# Altium integrated library LSMD PCB.IntLib: 93 symbols
Pins are listed as number, name and electrical type; pins without a type are passive.

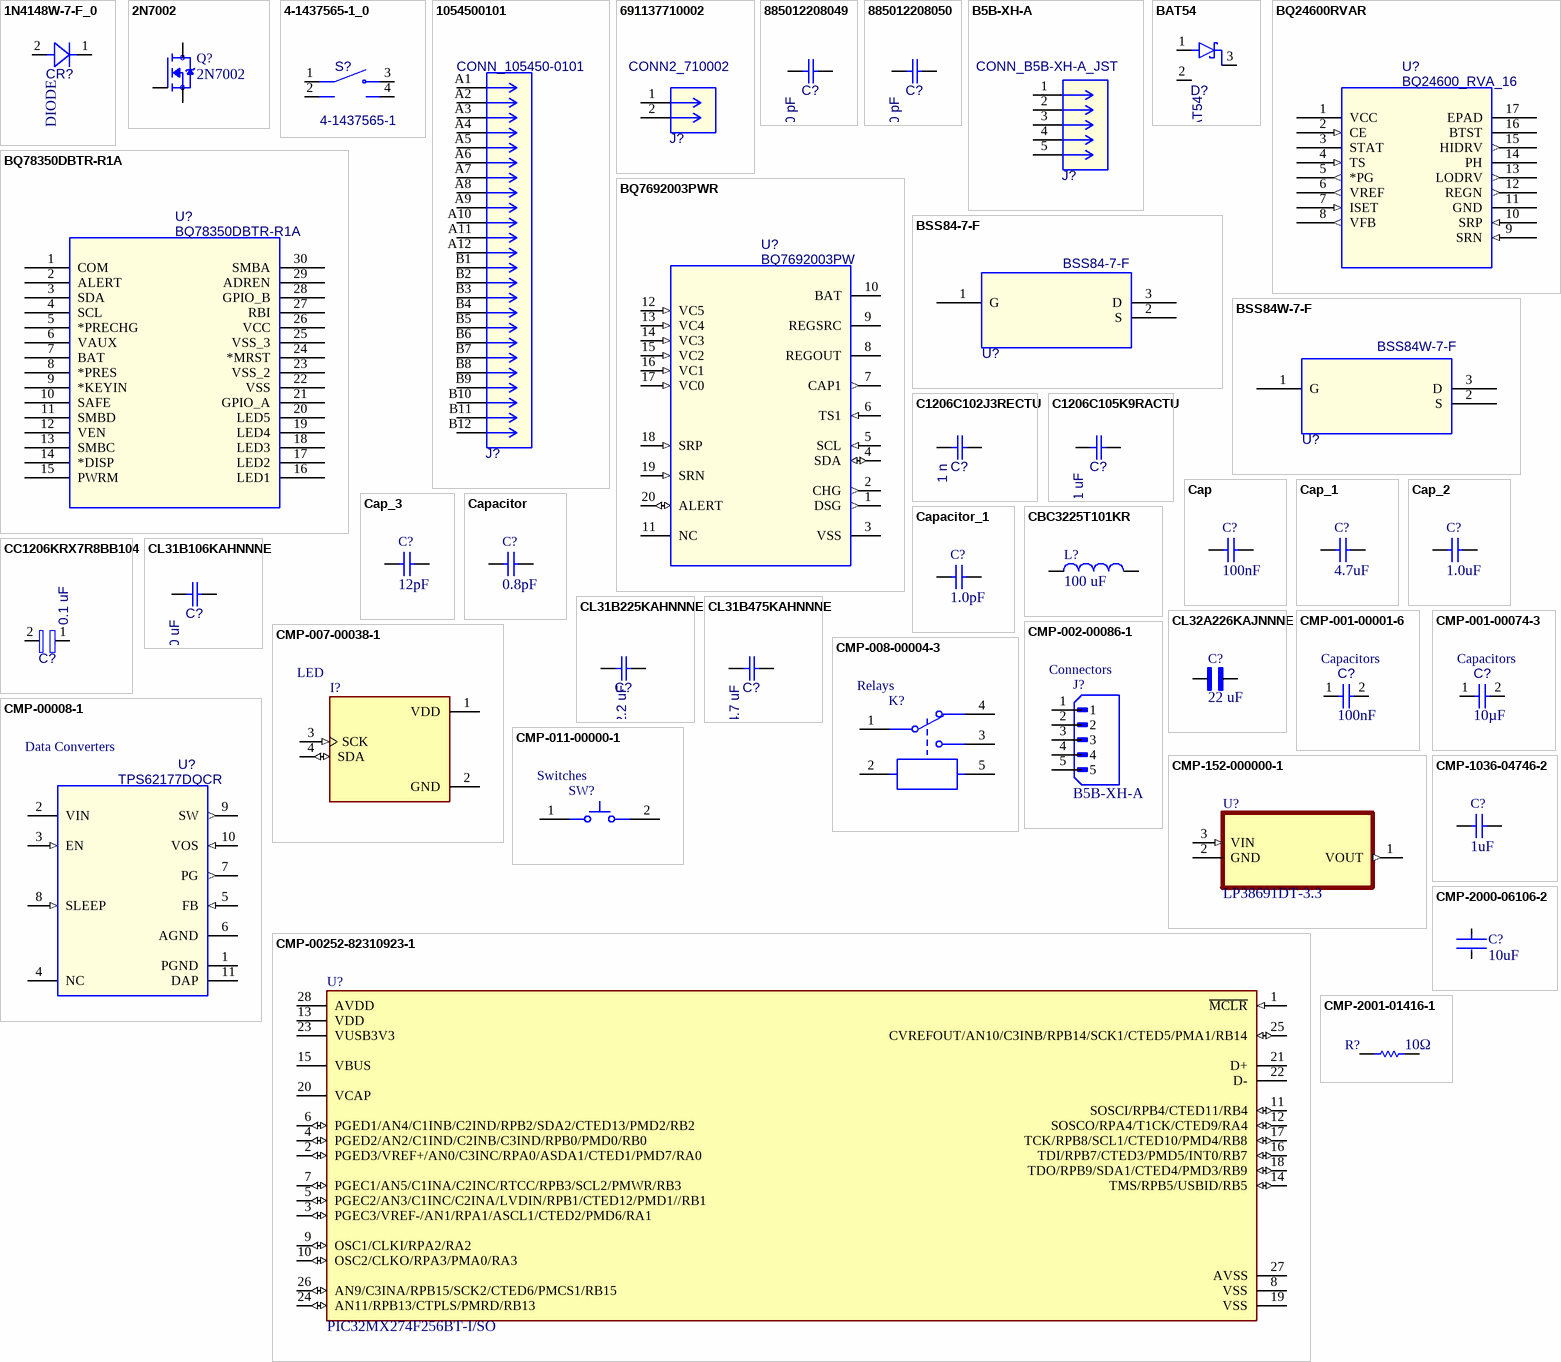
[diagram p0: symbols 1N4148W-7-F_0 to CMP-2001-01416-1]

## 1N4148W-7-F_0
designator CR?, comment DIODE
DIODE; SWT; SMT (SOD-123); PIV=100V; IF=0.3A; -65 DEGC TO +150 DEGC; Manufacturer_Name: Diodes Inc; Manufacturer_Part_Number: 1N4148W-7-F; Part Reference: CR5; PCB Footprint: SOD123_DIO; Copyright: Copyright (C) 2025 Ultra Librarian. All rights reserved.; Value: DIODE; Manufacturer Name: Diodes Inc; Manufacturer Part Number: 1N4148W-7-F; Part Number: 1N4148W-7-F
footprint SOD123_DIO
pins: 1, 2

## 2N7002
designator Q?
Mosfet Array 2 N-Channel (Dual) 60V 300mA 500mW Surface Mount PG-SOT363-6; MF: onsemi; SnapEDA_Link: https://www.snapeda.com/parts/2N7002/Onsemi/view-part/?ref=snap; Package: SOT-23-3 ON Semiconductor; Value: *; MP: 2N7002; Check_prices: https://www.snapeda.com/parts/2N7002/Onsemi/view-part/?ref=eda
footprint SOT95P240X111-3N
pins: 1 G, 2 S, 3 D

## 4-1437565-1_0
designator S?, comment 4-1437565-1
Part Reference: S1; Manufacturer Name: TE Connectivity; PCB Footprint: SW_4-1437565-1; OriginalSymbolOrigin: (-20000,10000); Value: 4-1437565-1; Manufacturer Part Number: 4-1437565-1; Part Number: 4-1437565-1
footprint SW_4-1437565-1
pins: 1 COM, 2 COM__1, 3 NO, 4 NO__1

## 1054500101
designator J?, comment CONN_105450-0101
Universal Serial Bus (USB) Shielded I/O Receptacle, Type C, Right-Angle, Top Mount, Surface Mount, 0.80mm Solder Tabs, Gold (Au) Flash over 0.76m Palladium Nickel Plating; Manufacturer_Name: Molex Connector Corporation; Manufacturer_Part_Number: 1054500101; Part Reference: J3; PCB Footprint: CONN_105450-0101_MOL; Copyright: Copyright (C) 2025 Ultra Librarian. All rights reserved.; Datasheet: https://www.molex.com/en-us/products/part-detail-pdf/1054500101?display=pdf; Value: CONN_105450-0101; Part Number: 1054500101; Manufacturer Part Number: 1054500101; Manufacturer Name: Molex Connector Corporation
footprint CONN_105450-0101_MOL
pins: A1, A2, A3, A4, A5, A6, A7, A8, A9, A10, A11, A12, B1, B2, B3, B4, B5, B6, B7, B8, B9, B10, B11, B12

## 691137710002
designator J?, comment CONN2_710002
WR-TBL Terminal block - Wire protector - THT; Manufacturer_Part_Number: 691137710002; Manufacturer_Name: Wurth Electronics; Part Reference: J2; PCB Footprint: CONN2_710002_WRE; Datasheet: https://www.we-online.com/catalog/datasheet/691137710002.pdf; Copyright: Copyright (C) 2025 Ultra Librarian. All rights reserved.; Value: CONN2_710002; Part Number: 691137710002; Manufacturer Part Number: 691137710002; Manufacturer Name: Wurth Electronics
footprint CONN2_710002_WRE
pins: 1, 2

## 885012208049
designator C?, comment 3300 pF
WCAP-CSGP General Purpose MLCC; Manufacturer_Name: Wurth Electronics; Manufacturer_Part_Number: 885012208049; Part Reference: C3; PCB Footprint: CAP_885012208_WRE; Copyright: Copyright (C) 2025 Ultra Librarian. All rights reserved.; Datasheet: https://www.we-online.com/catalog/datasheet/885012208049.pdf; Value: 3300 pF; Part Number: 885012208049; Manufacturer Part Number: 885012208049; Manufacturer Name: Wurth Electronics
footprint CAP_885012208_WRE
pins: 1, 2

## 885012208050
designator C?, comment 4700 pF
WCAP-CSGP General Purpose MLCC; Manufacturer_Name: Wurth Electronics; Manufacturer_Part_Number: 885012208050; Part Reference: C20; PCB Footprint: CAP_885012208_WRE; Copyright: Copyright (C) 2025 Ultra Librarian. All rights reserved.; Datasheet: https://www.we-online.com/catalog/datasheet/885012208050.pdf; Value: 4700 pF; Part Number: 885012208050; Manufacturer Part Number: 885012208050; Manufacturer Name: Wurth Electronics
footprint CAP_885012208_WRE
pins: 1, 2

## B5B-XH-A
designator J?, comment CONN_B5B-XH-A_JST
Manufacturer_Name: JST; Part Reference: J1; Manufacturer_Part_Number: B5B-XH-A; Copyright: Copyright (C) 2025 Ultra Librarian. All rights reserved.; Value: CONN_B5B-XH-A_JST; PCB Footprint: CONN_B5B-XH-A_JST; Manufacturer Name: JST; Manufacturer Part Number: B5B-XH-A; Part Number: B5B-XH-A
footprint CONN_B5B-XH-A_JST
pins: 1, 2, 3, 4, 5

## BAT54
designator D?
Schottky, SOT-23, 30V, 0.2A, 150C; Part Reference: D1; PCB Footprint: SOT95P240X120-3N; MF: Diotec; OriginalSymbolOrigin: (-10000,20000); SnapEDA_Link: https://www.snapeda.com/parts/BAT54/Diotec/view-part/?ref=snap; Package: SOT-23 Diotec; MP: BAT54; Check_prices: https://www.snapeda.com/parts/BAT54/Diotec/view-part/?ref=eda; Value: BAT54; Part Number: BAT54; Manufacturer Part Number: BAT54; Manufacturer Name: Diotec
footprint SOT95P240X120-3N
pins: 1, 2 NC, 3

## BQ24600RVAR
designator U?, comment BQ24600_RVA_16
Standalone 1-6 cell Buck battery charge controller 16-VQFN -40 to 85; Manufacturer_Part_Number: BQ24600RVAR; Manufacturer_Name: Texas Instruments; Part Reference: U3; PCB Footprint: RVA16_2P14X2P14; Datasheet: https://www.ti.com/lit/gpn/bq24600; Copyright: Copyright (C) 2025 Ultra Librarian. All rights reserved.; Value: BQ24600_RVA_16; Manufacturer Name: Texas Instruments; Manufacturer Part Number: BQ24600RVAR; Part Number: BQ24600RVAR
footprint RVA16_2P14X2P14
pins: 1 VCC (power), 2 CE (in), 3 STAT, 4 TS (in), 5 *PG (out), 6 VREF (out), 7 ISET (in), 8 VFB (out), 9 SRN (in), 10 SRP (in), 11 GND (power), 12 REGN (out), 13 LODRV (out), 14 PH, 15 HIDRV (out), 16 BTST, 17 EPAD (power)

## BQ78350DBTR-R1A
designator U?
CEDV li-ion gas gauge and battery management controller 30-TSSOP -40 to 85; Manufacturer_Name: Texas Instruments; Part Reference: U2; PCB Footprint: BQ78350DBTR-R1A_TEX; Datasheet: https://www.ti.com/lit/gpn/bq78350-r1a; Manufacturer_Part_Number: BQ78350DBTR-R1A; Copyright: Copyright (C) 2025 Ultra Librarian. All rights reserved.; Value: BQ78350DBTR-R1A; Manufacturer Name: Texas Instruments; Manufacturer Part Number: BQ78350DBTR-R1A; Part Number: BQ78350DBTR-R1A
footprint BQ78350DBTR-R1A_TEX
pins: 1 COM, 2 ALERT, 3 SDA, 4 SCL, 5 *PRECHG, 6 VAUX, 7 BAT, 8 *PRES, 9 *KEYIN, 10 SAFE, 11 SMBD, 12 VEN, 13 SMBC, 14 *DISP, 15 PWRM, 16 LED1, 17 LED2, 18 LED3, 19 LED4, 20 LED5, 21 GPIO_A, 22 VSS, 23 VSS_2, 24 *MRST, 25 VSS_3, 26 VCC, 27 RBI, 28 GPIO_B, 29 ADREN, 30 SMBA

## BQ7692003PWR
designator U?, comment BQ7692003PW
3 to 5-Series Cell Li-Ion and Li-Phosphate Battery Monitor (bq76940 Family) 20-TSSOP -40 to 85; Manufacturer_Part_Number: BQ7692003PWR; Manufacturer_Name: Texas Instruments; Part Reference: U4; Value: BQ7692000PW; PCB Footprint: PW0020A_N; Datasheet: https://www.ti.com/lit/gpn/bq76920; Copyright: Copyright (C) 2025 Ultra Librarian. All rights reserved.; Part Number: BQ7692003PWR; Manufacturer Part Number: BQ7692003PWR; Manufacturer Name: Texas Instruments
footprint PW0020A_N
pins: 1 DSG (out), 2 CHG (out), 3 VSS (power), 4 SDA (io), 5 SCL (in), 6 TS1 (in), 7 CAP1 (out), 8 REGOUT (power), 9 REGSRC (power), 10 BAT (power), 11 NC, 12 VC5 (in), 13 VC4 (in), 14 VC3 (in), 15 VC2 (in), 16 VC1 (in), 17 VC0 (in), 18 SRP (in), 19 SRN (in), 20 ALERT (io)

## BSS84-7-F
designator U?
Manufacturer_Name: Diodes Inc; Part Reference: U1; PCB Footprint: SOT-23_DIO; Copyright: Copyright (C) 2025 Ultra Librarian. All rights reserved.; Manufacturer_Part_Number: BSS84-7-F; Value: BSS84-7-F; Part Number: BSS84-7-F; Manufacturer Part Number: BSS84-7-F; Manufacturer Name: Diodes Inc
footprint SOT-23_DIO
pins: 1 G, 2 S, 3 D

## BSS84W-7-F
designator U?
Manufacturer_Name: Diodes Inc; Part Reference: U5; PCB Footprint: SOT-323_DIO; Manufacturer_Part_Number: BSS84W-7-F; Copyright: Copyright (C) 2025 Ultra Librarian. All rights reserved.; Value: BSS84W-7-F; Part Number: BSS84W-7-F; Manufacturer Part Number: BSS84W-7-F; Manufacturer Name: Diodes Inc
footprint SOT-323_DIO
pins: 1 G, 2 S, 3 D

## C1206C102J3RECTU
designator C?, comment 1 n
ESD SMD Comm X7R, Ceramic, 1000 pF, 5p, 25 VDC, X7R, SMD, MLCC, Temperature Stable, Electro Static Discharge, Class II, 1206; Manufacturer_Name: Kemet; Manufacturer_Part_Number: C1206C102J3RECTU; Part Reference: C2; PCB Footprint: CAPC340180_88N_KEM; Copyright: Copyright (C) 2025 Ultra Librarian. All rights reserved.; Datasheet: https://content.kemet.com/datasheets/KEMC1090X7RESD.pdf; Value: 1 n; Part Number: C1206C102J3RECTU; Manufacturer Part Number: C1206C102J3RECTU; Manufacturer Name: Kemet
footprint CAPC340180_88N_KEM
pins: 1, 2

## C1206C105K9RACTU
designator C?, comment 1 uF
SMD Comm X7R, Ceramic, 1 uF, 10p, 6.3 VDC, X7R, SMD, MLCC, Temperature Stable, Class II, 1206; Manufacturer_Name: Kemet; Manufacturer_Part_Number: C1206C105K9RACTU; Part Reference: C8; PCB Footprint: CAPC340180_140N_KEM; Copyright: Copyright (C) 2025 Ultra Librarian. All rights reserved.; Datasheet: https://content.kemet.com/datasheets/KEMC1002X7RSMD.pdf; Value: 1 uF; Manufacturer Name: Kemet; Manufacturer Part Number: C1206C105K9RACTU; Part Number: C1206C105K9RACTU
footprint CAPC340180_140N_KEM
pins: 1, 2

## Cap
designator C?  value 100nF
Capacitor; Published: 8-Jun-2000; LatestRevisionDate: 17-Jul-2002; LatestRevisionNote: Re-released for DXP Platform.; PackageReference: RAD-0.3; Publisher: Altium Limited; PackageDescription: Radial Cap, Thru-Hole; 2 Leads; 0.3 in Pin Spacing
footprint RAD-0.3 (Radial Cap, Thru-Hole; 2 Leads; 0.3 in Pin Spacing)
simulation model CAP (Capacitor)
signal-integrity model Cap
pins: 1, 2

## Cap_1
designator C?  value 4.7uF
Capacitor; Published: 8-Jun-2000; LatestRevisionDate: 17-Jul-2002; LatestRevisionNote: Re-released for DXP Platform.; PackageReference: RAD-0.3; Publisher: Altium Limited; PackageDescription: Radial Cap, Thru-Hole; 2 Leads; 0.3 in Pin Spacing
footprint RAD-0.3 (Radial Cap, Thru-Hole; 2 Leads; 0.3 in Pin Spacing)
simulation model CAP (Capacitor)
signal-integrity model Cap
pins: 1, 2

## Cap_2
designator C?  value 1.0uF
Capacitor; Published: 8-Jun-2000; LatestRevisionDate: 17-Jul-2002; LatestRevisionNote: Re-released for DXP Platform.; PackageReference: RAD-0.3; Publisher: Altium Limited; PackageDescription: Radial Cap, Thru-Hole; 2 Leads; 0.3 in Pin Spacing
footprint RAD-0.3 (Radial Cap, Thru-Hole; 2 Leads; 0.3 in Pin Spacing)
simulation model CAP (Capacitor)
signal-integrity model Cap
pins: 1, 2

## Cap_3
designator C?  value 12pF
Capacitor; Published: 8-Jun-2000; LatestRevisionDate: 17-Jul-2002; LatestRevisionNote: Re-released for DXP Platform.; PackageReference: RAD-0.3; Publisher: Altium Limited; PackageDescription: Radial Cap, Thru-Hole; 2 Leads; 0.3 in Pin Spacing
footprint RAD-0.3 (Radial Cap, Thru-Hole; 2 Leads; 0.3 in Pin Spacing)
simulation model CAP (Capacitor)
signal-integrity model Cap
pins: 1, 2

## Capacitor
designator C?  value 0.8pF  (hidden comment: Capacitor)
SimulationGenericComponent: True
simulation model C_Capacitor_Default (CAP)
pins: 1, 2

## Capacitor_1
designator C?, comment value 1.0pF  (hidden comment: Capacitor)
SimulationGenericComponent: True
simulation model C_Capacitor_Default (CAP)
pins: 1, 2

## CBC3225T101KR
designator L?, comment 100 uF
100ÂµH Unshielded Wirewound Inductor 340mA 1.82Ohm Max 1210 _3225 Metric_; MP: CBC3225T101KR; MF: Taiyo Yuden; Price: None; SnapEDA_Link: https://www.snapeda.com/parts/CBC3225T101KR/Taiyo%20Yuden/view-part/1502545/?ref=snap; Package: 3225 Taiyo Yuden; Value: *; Availability: Unavailable
footprint INDC3225X270N
pins: 1, 2

## CC1206KRX7R8BB104
designator C?, comment 0.1 uF
Part Reference: C15; Manufacturer Name: Yageo; Manufacturer Part Number: CC1206KRX7R8BB104; PCB Footprint: RESC3116X65N; OriginalSymbolOrigin: (0,10000); Value: 0.1 uF; Part Number: CC1206KRX7R8BB104
footprint RESC3116X65N
pins: 1, 2

## CL31B106KAHNNNE
designator C?, comment 10 uF
Manufacturer_Name: Samsung; Manufacturer_Part_Number: CL31B106KAHNNNE; Part Reference: C5; PCB Footprint: CAP_CL31_SAM; Copyright: Copyright (C) 2025 Ultra Librarian. All rights reserved.; Value: 10 uF; Part Number: CL31B106KAHNNNE; Manufacturer Part Number: CL31B106KAHNNNE; Manufacturer Name: Samsung
footprint CAP_CL31_SAM
pins: 1, 2

## CL31B225KAHNNNE
designator C?, comment 2.2 uF
Manufacturer_Name: Samsung; Manufacturer_Part_Number: CL31B225KAHNNNE; Part Reference: C6; PCB Footprint: CAP_CL31_SAM; Copyright: Copyright (C) 2025 Ultra Librarian. All rights reserved.; Value: 2.2 uF; Part Number: CL31B225KAHNNNE; Manufacturer Part Number: CL31B225KAHNNNE; Manufacturer Name: Samsung
footprint CAP_CL31_SAM
pins: 1, 2

## CL31B475KAHNNNE
designator C?, comment 4.7 uF
Manufacturer_Name: Samsung; Manufacturer_Part_Number: CL31B475KAHNNNE; Part Reference: C21; PCB Footprint: CAP_CL31_SAM; Copyright: Copyright (C) 2025 Ultra Librarian. All rights reserved.; Value: 4.7 uF; Part Number: CL31B475KAHNNNE; Manufacturer Part Number: CL31B475KAHNNNE; Manufacturer Name: Samsung
footprint CAP_CL31_SAM
pins: 1, 2

## CL32A226KAJNNNE
designator C?, comment 22 uF
Capacitor: ceramic; MLCC; 22uF; 25V; X5R; Â±10%; SMD; 1210; -55Ã·85Â°C; MF: Samsung Electro-Mechanics; MP: CL32A226KAJNNNE; SnapEDA_Link: https://www.snapeda.com/parts/CL32A226KAJNNNE/Samsung/view-part/?ref=snap; Package: SMD-2 Samsung; Value: *; Check_prices: https://www.snapeda.com/parts/CL32A226KAJNNNE/Samsung/view-part/?ref=eda
footprint CAPC3225X270N
pins: 1, 2

## CMP-001-00001-6
designator C?, comment value 100nF  Component Type: Capacitors  (hidden comment: Capacitor 0.1 uF +/- 5% 16 V 0402)
Chip Capacitor, 0.1 uF, +/- 5%, 16 V, 0402 (1005 Metric); Manufacturer: KEMET; Manufacturer Part Number: C0402C104J4RACTU; Manufacturer: Murata; Manufacturer Part Number: GRM155R71C104JA88D; Voltage Rating: 16V; Capacitor Type: Ceramic; Pins: 2; Max Operating Temperature: 125°C; Mounting Technology: SM; Case/Package: 0402; Min Operating Temperature: -55°C; RoHS Compliant: True; Tolerance: 5%
footprint CAPC1005X56X25LL10T15 (Chip Capacitor, 2-Leads, Body 1.10x0.60mm, IPC High Density)
footprint CAPC1005X56X25NL10T15 (Chip Capacitor, 2-Leads, Body 1.10x0.60mm, IPC Medium Density)
footprint CAPC1005X56X25ML10T15 (Chip Capacitor, 2-Leads, Body 1.10x0.60mm, IPC Low Density)
pins: 1, 2

## CMP-001-00074-3
designator C?, comment value 10µF  Component Type: Capacitors  (hidden comment: Capacitor 10µF +/-40% 6.3V 0402)
Chip Capacitor, 10µF +/-40%, 6.3V, 0402, Thickness 0.6 mm; Manufacturer: Murata; Manufacturer Part Number: GRM155R60J106ME15D; Tolerance: 10%; Max Operating Temperature: 85°C; Voltage Rating: 6.3V; Case/Package: 0402; Min Operating Temperature: -55°C; Mounting Technology: SMT; Pins: 2
footprint CAPC0402(1005)60_L (Chip Capacitor, Body 1.0x0.5mm, Height 0.6mm, IPC High Density)
pins: 1, 2

## CMP-002-00086-1
designator J?, comment B5B-XH-A  Component Type: Connectors
Connector Header Through Hole 5 position 0.098 (2.50mm); MF: JST Sales; Source: B5B-XH-A.SchLib; Case/Package: None; SnapEDA_Link: https://www.snapeda.com/parts/B5B-XH-A/JST+Sales+America+Inc./view-part/?ref=snap; Component Type: Standard; Pins: 5; MP: B5B-XH-A; Value: *; Check_prices: https://www.snapeda.com/parts/B5B-XH-A/JST+Sales+America+Inc./view-part/?ref=eda; Design Item ID: B5B-XH-A
footprint JST_B5B-XH-A
pins: 1, 2, 3, 4, 5

## CMP-007-00038-1
designator I?  Component Type: LED
Non-Touch Graphic LCD Display Module Transmissive White OLED, Monochrome I2C 1.3 (33.02mm) 128 x 64; MP: OLED 128x64 1.3&quot; I2C; MF: UNIVERSAL-SOLDER Electronics Ltd; SnapEDA_Link: https://www.snapeda.com/parts/OLED%20128x64%201.3%22%20I2C/UNIVERSAL-SOLDER+Electronics+Ltd/view-part/?ref=snap; Design Item ID: OLED_128X64_1.3_I2C; Component Type: Standard; Value: *; Check_prices: https://www.snapeda.com/parts/OLED%20128x64%201.3%22%20I2C/UNIVERSAL-SOLDER+Electronics+Ltd/view-part/?ref=eda; Pins: 4; Case/Package: None; Source: OLED_128X64_1.3_I2C.SchLib
footprint LCD_OLED_128X64_1.3_I2C
pins: 1 VDD (power), 2 GND (power), 3 SCK (in), 4 SDA (io)

## CMP-00008-1
designator U?, comment TPS62177DQCR  Component Type: Data Converters
28V, 0.5A Step-Down Converter with SNOOZE Mode 10-WSON -40 to 85; Manufacturer_Name: Texas Instruments; Part Reference: U10; PCB Footprint: DQC0010A; TYPE: TYPE; RefDes: RefDes; Copyright: Copyright (C) 2026 Ultra Librarian. All rights reserved.; Manufacturer_Part_Number: TPS62177DQCR; Datasheet: https://www.ti.com/lit/gpn/tps62177; Value: TPS62177DQC; Manufacturer Name: Texas Instruments; Manufacturer Part Number: TPS62177DQCR; Part Number: TPS62177DQCR
footprint DQC0010A
pins: 1 PGND (power), 2 VIN (power), 3 EN (in), 4 NC, 5 FB (in), 6 AGND (power), 7 PG (out), 8 SLEEP (in), 9 SW (out), 10 VOS (in), 11 DAP (power)

## CMP-008-00004-3
designator K?  Component Type: Relays
General Purpose Relay, 24 VDC, 8 A, -40 to 70 degC, 5-Pin THD, RoHS, Bulk; Manufacturer: TE Connectivity; Manufacturer: TE Connectivity (Tyco Electronics); Manufacturer Part Number: RY210024; Contact Form: SPDT; Current Rating: 10A; Operate Time: 9ms; Pins: 5; Datasheet URL: http://www.te.com/commerce/DocumentDelivery/DDEController?Action=showdoc&DocId=Data+Sheet%7FRYII%7F0115%7Fpdf%7FEnglish%7FENG_DS_RYII_0115.pdf%7F3-1393224-8; Max Operating Temperature: 70°C; RoHS Compliant: True; Mounting Technology: ThroughHole; Datasheet Version: Rev. 0115, 01/2015; Min Operating Temperature: -40°C; Package Description: 5-Pin Through Hole Device, Body 28.5 x 10.1 mm; Package Reference: RY210024
footprint TECO-RY210024_V (THD, 5-Leads, Body 28.5x10.1mm)
pins: 1, 2, 3, 4, 5

## CMP-011-00000-1
designator SW?  Component Type: Switches
Tactile Switch, SPST-NO, 0.05 A, 12 V, -25 to 70 degC, 2-Pin SMD, RoHS, Tape and Reel; Manufacturer: Omron Electronic Components; Manufacturer: Omron; Manufacturer Part Number: B3U-1000P; Contact Current Rating: 50mA; Max Voltage Rating (DC): 12V; Resistance: 0.1Ohm; Max Contact Resistance: 100mohm; Throw Configuration: SPST; Operating Force: 153gf; IP Rating: IP40; Min Operating Temperature: -25°C; RoHS Compliant: True; Package Description: 2-Pin Surface Mount Device, Body 3 x 2.5 mm; Packaging: TapeandReel; Package Reference: B3U-1000; Datasheet URL: http://www.omron.com/ecb/products/pdf/en-b3u.pdf; Contact Material: Silver; Max Current Rating: 50mA; Max Operating Temperature: 70°C; Voltage Rating: 12V; Voltage Rating (DC): 12V; Datasheet Version: Jan-15; Manufacturer URL: http://www.omron.com/; Current Rating: 50mA; Case/Package: B3U-1000; Package Quantity: 3500; Mounting Technology: SM
footprint OMRON-B3U-1000_V (SMD, 2-Leads, Body 3x2.5mm)
pins: 1, 2

## CMP-152-000000-1
designator U?, comment LP38691DT-3.3
500-mA, 10-V, low-dropout voltage regulator 3-TO-252 -40 to 125; MF: Texas Instruments; Check_prices: https://www.snapeda.com/parts/LP38691DT-3.3/Texas+Instruments/view-part/?ref=eda; Value: *; Availability: In Stock; MP: LP38691DT-3.3; Price: None; Package: TO-252-3 Texas Instruments; SnapEDA_Link: https://www.snapeda.com/parts/LP38691DT-3.3/Texas+Instruments/view-part/?ref=snap; Purchase-URL: https://pricing.snapeda.com/search/part/LP38691DT-3.3/?ref=eda
footprint TO228P1042X238-3N
pins: 1 VOUT (out), 2 GND, 3 VIN (in)

## CMP-00252-82310923-1
designator U?, comment PIC32MX274F256BT-I/SO
PIC32MX274F256BT-I/SO MCU 32-bit MIPS32 M4K RISC 256KB Flash 2.5V/3.3V 28-Pin SOIC W T/R; NexarPartId: 82310923; Number of Timers/Counters: 5; Number of SPI Channels: 2; Interface: I2C, I2S, IrDA, LIN, Parallel, SPI, UART, USB; Number of A/D Converters: 1; Max Supply Voltage: 3.6V; Number of I/Os: 17; Frequency: 72MHz; Data Bus Width: 32b; Max Junction Temperature (Tj): 125°C; RAM Size: 64kB; Number of ADC Channels: 9; Min Supply Voltage: 2.5V; Schedule B: 8542310000, 8542310000; Min Operating Temperature: -40°C; RoHS: Non-Compliant; Number of USB Channels: 1; Number of PWM Channels: 5; Height: 2.65mm; Max Operating Temperature: 85°C; Number of UART Channels: 2; Number of I2C Channels: 2; Memory Size: 256kB; Memory Type: FLASH; Ambient Temperature Range High: 85°C; Lifecycle Status: Production
footprint FP-C04-052-MFG (MCU 32-bit MIPS32 M4K RISC 256KB Flash 2.5V/3.3V 28-Pin SOIC W T/R)
footprint FP-C04-052-IPC_A (MCU 32-bit MIPS32 M4K RISC 256KB Flash 2.5V/3.3V 28-Pin SOIC W T/R)
footprint FP-C04-052-IPC_B (MCU 32-bit MIPS32 M4K RISC 256KB Flash 2.5V/3.3V 28-Pin SOIC W T/R)
footprint FP-C04-052-IPC_C (MCU 32-bit MIPS32 M4K RISC 256KB Flash 2.5V/3.3V 28-Pin SOIC W T/R)
pins: 1 ~{MCLR} (in), 2 PGED3/VREF+/AN0/C3INC/RPA0/ASDA1/CTED1/PMD7/RA0 (io), 3 PGEC3/VREF-/AN1/RPA1/ASCL1/CTED2/PMD6/RA1 (io), 4 PGED2/AN2/C1IND/C2INB/C3IND/RPB0/PMD0/RB0 (io), 5 PGEC2/AN3/C1INC/C2INA/LVDIN/RPB1/CTED12/PMD1//RB1 (io), 6 PGED1/AN4/C1INB/C2IND/RPB2/SDA2/CTED13/PMD2/RB2 (io), 7 PGEC1/AN5/C1INA/C2INC/RTCC/RPB3/SCL2/PMWR/RB3 (io), 8 VSS (power), 9 OSC1/CLKI/RPA2/RA2 (io), 10 OSC2/CLKO/RPA3/PMA0/RA3 (io), 11 SOSCI/RPB4/CTED11/RB4 (io), 12 SOSCO/RPA4/T1CK/CTED9/RA4 (io), 13 VDD (power), 14 TMS/RPB5/USBID/RB5 (io), 15 VBUS (power), 16 TDI/RPB7/CTED3/PMD5/INT0/RB7 (io), 17 TCK/RPB8/SCL1/CTED10/PMD4/RB8 (io), 18 TDO/RPB9/SDA1/CTED4/PMD3/RB9 (io), 19 VSS (power), 20 VCAP (power), 21 D+, 22 D-, 23 VUSB3V3 (power), 24 AN11/RPB13/CTPLS/PMRD/RB13 (io), 25 CVREFOUT/AN10/C3INB/RPB14/SCK1/CTED5/PMA1/RB14 (io), 26 AN9/C3INA/RPB15/SCK2/CTED6/PMCS1/RB15 (io), 27 AVSS (power), 28 AVDD (power)

## CMP-1036-04746-2
designator C?, comment 1uF
Manufacturer: Kemet; Part Number: C0805C105K4PACTU
footprint CAPC2013X145X50LL20T25 (Chip Capacitor, 2-Leads, Body 2.00x1.25mm, IPC High Density)
footprint CAPC2013X145X50NL20T25 (Chip Capacitor, 2-Leads, Body 2.00x1.25mm, IPC Medium Density)
footprint CAPC2013X145X50ML20T25 (Chip Capacitor, 2-Leads, Body 2.00x1.25mm, IPC Low Density)
pins: 1, 2
1 alternate drawing of the same symbol

## CMP-2000-06106-2
designator C?, comment 10uF
CAP CER 10UF 16V X7R 0805; Manufacturer Part Number: CL21B106KOQNNNE; Manufacturer: Samsung Electro-Mechanics America, Inc; Material: Ceramic; Tolerance: 10%; Temperature Coefficient: 15%; Digikey Description: CAP CER 10UF 16V X7R 0805; Lead Free: Yes; ComponentLink2URL: http://www.samsungsem.com/servlet/FileDownload?path=productsearch&sname=CL21B106KOQNNNE.pdf&oname=CL21B106KOQNNNE.pdf; ComponentLink2Description: Datasheet; Temperature Range Low: -55°C; RoHS: TRUE; Category: Cap; Temperature Characteristic: X7R; Automotive: No; Octopart: https://octopart.com/cl21b106koqnnne-samsung-19832289; Device Class L3: Ceramic Capacitors; Temperature Range High: +125°C; Height: 1.4mm; Device Class L2: Capacitors; Voltage Rating: 16V; Value: 10uF; Temperature: -55°C to +125°C; Device Class L1: Passive Components; Ipc Land Pattern Name: CAPC200125X125; Package: CL21B106KOQNNNE; Capacitance: 10uF
footprint FP-CL21B106KOQNNNE-MFG
footprint FP-CL21B106KOQNNNE-IPC_C
footprint FP-CL21B106KOQNNNE-IPC_B
footprint FP-CL21B106KOQNNNE-IPC_A
pins: 1, 2

## CMP-2001-01416-1
designator R?, comment 10Ω
Manufacturer: Yageo; Part Number: RC0805JR-1310RL
footprint RESC2013X60X35NL10T20 (Chip Resistor, 2-Leads, Body 2.00x1.25mm, IPC Medium Density)
footprint RESC2013X60X35LL10T20 (Chip Resistor, 2-Leads, Body 2.00x1.25mm, IPC High Density)
footprint RESC2013X60X35ML10T20 (Chip Resistor, 2-Leads, Body 2.00x1.25mm, IPC Low Density)
pins: 1, 2
1 alternate drawing of the same symbol

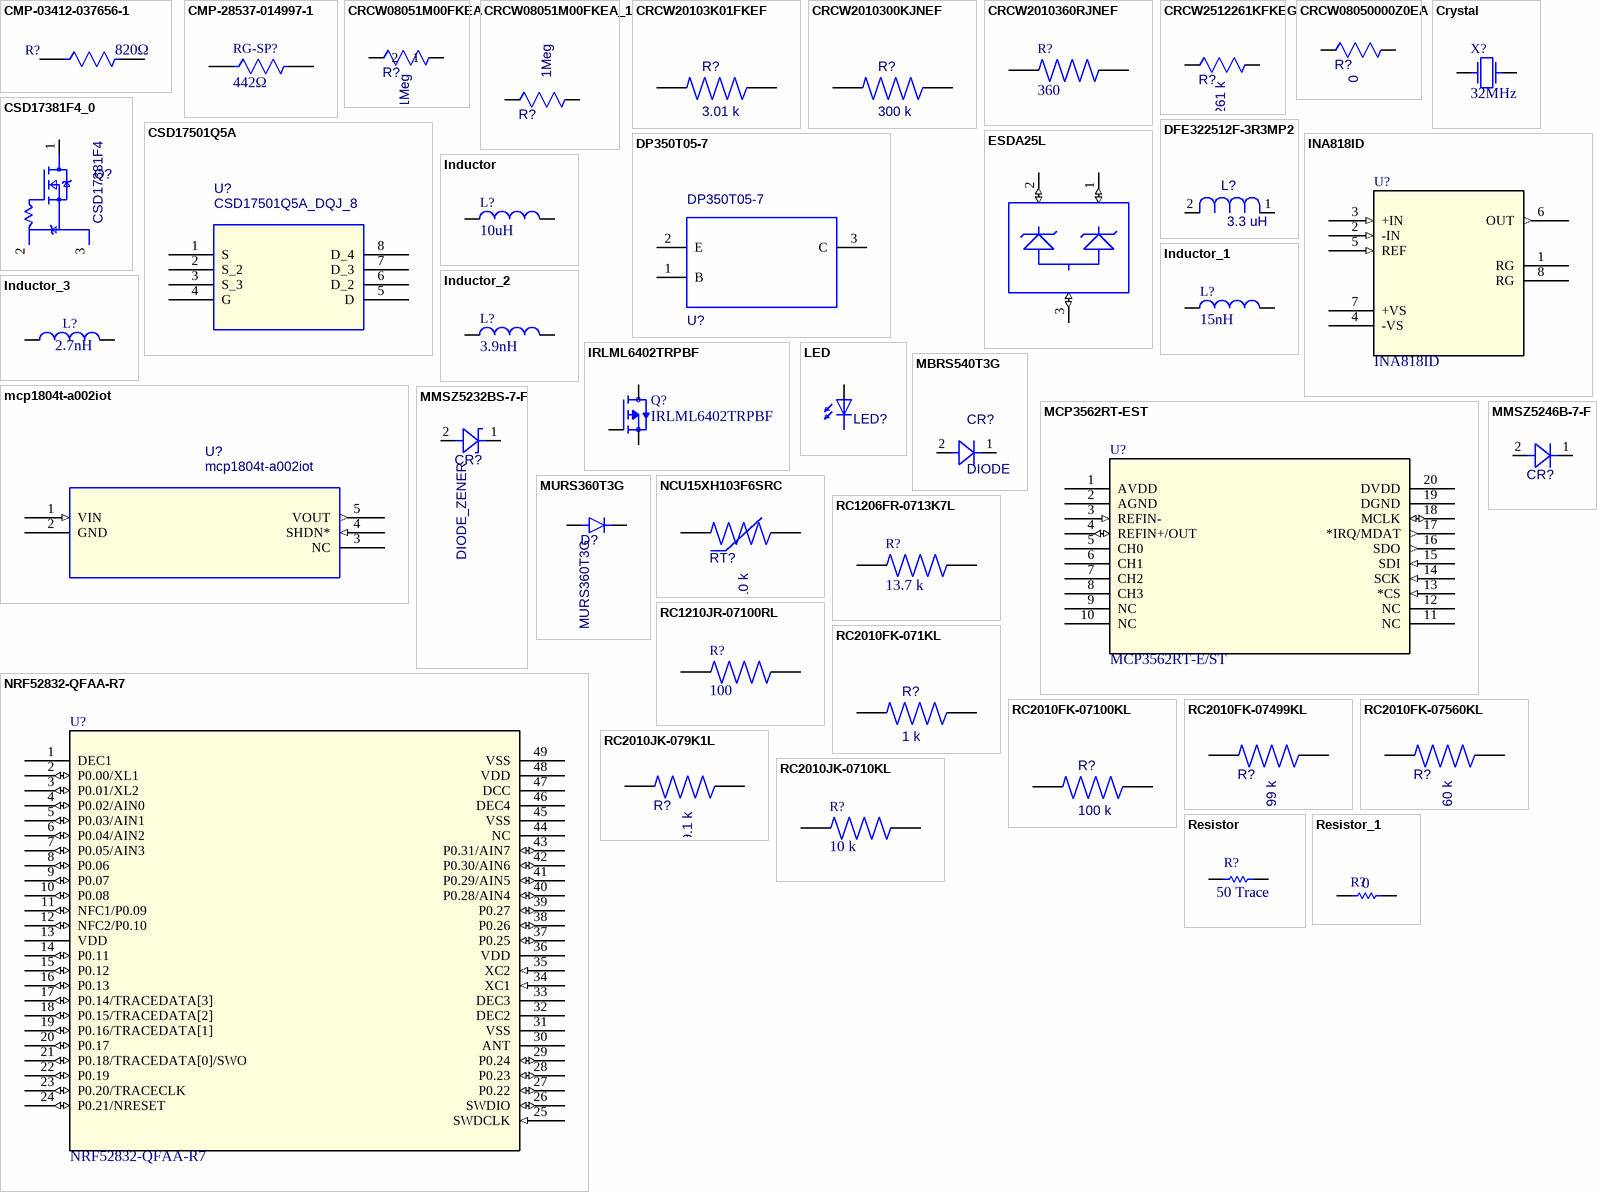
[diagram p1: symbols CMP-03412-037656-1 to Resistor_1]

## CMP-03412-037656-1
designator R?, comment 820Ω
RES SMD 820 OHM 1% 1/8W 0805; Manufacturer: Yageo; Manufacturer Part Number: AC0805FR-07820RL; Voltage Rating: 150V; Tolerance: 0.01; Automotive Grade: Grade 0; Category: Res; Temperature Range Low: -55°C; Lead Free: Yes; Composition: Thick Film; Device Class L1: Passive Components; ComponentLink2URL: http://www.yageo.com/documents/recent/PYu-AC_51_RoHS_L_6.pdf; Ipc Land Pattern Name: RESC200125X50; Series: AC; Package: AC0805; Device Class L2: Resistors; Value: 820Ω; Octopart: https://octopart.com/ac0805fr-07820rl-yageo-26041182; RoHS: TRUE; Temperature Range High: +155°C; Automotive: Yes; Mouser Description: Thick Film Resistors - SMD 1/8W 820ohm 1% AEC-Q200; ComponentLink2Description: Datasheet; Digikey Description: RES SMD 820 OHM 1% 1/8W 0805; Power Rating: 1/8W; Height: 0.6mm; Footprint Url: http://www.yageo.com/exep/pages/download/literatures/PYu-R_Mount_10.pdf; Temperature: -55°C to +155°C; Resistance: 820Ω; Device Class L3: Chip SMD Resistors
footprint FP-AC0805-MFG
footprint FP-AC0805-IPC_C
footprint FP-AC0805-IPC_B
footprint FP-AC0805-IPC_A
pins: 1, 2

## CMP-28537-014997-1
designator RG-SP?, comment 442Ω
Automotive Metal Thin Film Chip Resistor, 0805, 442Ω, 0.1%, 25ppm/°C, 0.125W, 150V; Resistance: 442R; Power Rating: 100mW; Voltage Rating: 100V; Max Power Dissipation: 125mW; Case Code (Imperial): 0805; Features: Automotive AEC-Q200; Case Code (Metric): 2012; Number of Terminations: 2; Resistor Type: Thin Film; Temperature Coefficient: 25ppm/°C; Height: 0.02inch; Case/Package: 0805; Voltage Rating (DC): 150V; Package Quantity: 5000; Lead Free: Lead Free; Width: 1.25mm; Tolerance: 0.1%; Max Operating Temperature: 155°C; Termination: SMD/SMT; RoHS Compliant: Yes; Series: RG; Length: 0.079inch; Min Operating Temperature: -55°C; Packaging: Tape and Reel
footprint FP-RG2012-MFG
footprint FP-RG2012-IPC_C
footprint FP-RG2012-IPC_B
footprint FP-RG2012-IPC_A
pins: 1, 2

## CRCW08051M00FKEA
designator R?, comment 1Meg
D12/CRCW0805 100 1M 1p ET1 e3; Manufacturer_Part_Number: CRCW08051M00FKEA; Manufacturer_Name: Vishay; Part Reference: R11; PCB Footprint: RES_CRCW_0805; Datasheet: https://www.vishay.com/doc?20035; Copyright: Copyright (C) 2025 Ultra Librarian. All rights reserved.; Value: 1Meg; Part Number: CRCW08051M00FKEA; Manufacturer Part Number: CRCW08051M00FKEA; Manufacturer Name: Vishay
footprint RES_CRCW_0805
pins: 1, 2

## CRCW08051M00FKEA_1
designator R?, comment 1Meg
D12/CRCW0805 100 1M 1p ET1 e3; Manufacturer_Part_Number: CRCW08051M00FKEA; Manufacturer_Name: Vishay; Part Reference: R43; PCB Footprint: RES_CRCW_0805; Datasheet: https://www.vishay.com/doc?20035; Copyright: Copyright (C) 2025 Ultra Librarian. All rights reserved.; Value: 1Meg; Part Number: CRCW08051M00FKEA; Manufacturer Part Number: CRCW08051M00FKEA; Manufacturer Name: Vishay
footprint RES_CRCW_0805
pins: 1, 2

## CRCW20103K01FKEF
designator R?, comment 3.01 k
Part Reference: R30; Manufacturer Name: Vishay; Manufacturer Part Number: CRCW20103K01FKEF; OriginalSymbolOrigin: (-20000,10000); PCB Footprint: RESC5025X70N; Value: 3.01 k; Part Number: CRCW20103K01FKEF
footprint RESC5025X70N
pins: 1, 2

## CRCW2010300KJNEF
designator R?, comment 300 k
Part Reference: R5; Manufacturer Name: Vishay Dale; Manufacturer Part Number: CRCW2010300KJNEF; OriginalSymbolOrigin: (-20000,10000); PCB Footprint: RESC5025X70N; Value: 300 k; Part Number: CRCW2010300KJNEF
footprint RESC5025X70N
pins: 1, 2

## CRCW2010360RJNEF
designator R?, comment 360
Res Thick Film 2010 360 Ohm 5% 3/4W Â±200ppm/Â°C Molded SMD SMD Blister T/R; MP: CRCW2010360RJNEF; Package: None; Price: None; Value: *; Availability: Unavailable
footprint RESC5025X70N
pins: 1, 2

## CRCW2512261KFKEG
designator R?, comment 261 k
CRCW2512 100 261K 1p E67 e3; Manufacturer_Name: Vishay; Manufacturer_Part_Number: CRCW2512261KFKEG; Part Reference: R21; PCB Footprint: RC2512N_VIS; Copyright: Copyright (C) 2025 Ultra Librarian. All rights reserved.; Datasheet: https://www.vishay.com/doc?20035; Value: 261 k; Part Number: CRCW2512261KFKEG; Manufacturer Part Number: CRCW2512261KFKEG; Manufacturer Name: Vishay
footprint RC2512N_VIS
pins: 1, 2

## CRCW08050000Z0EA
designator R?, comment 0
D12/CRCW0805 0R0 ET1 e3; Manufacturer_Name: Vishay; Manufacturer_Part_Number: CRCW08050000Z0EA; Part Reference: R37; PCB Footprint: RES_CRCW_0805_VIS; Copyright: Copyright (C) 2025 Ultra Librarian. All rights reserved.; Datasheet: https://www.vishay.com/doc?20035; Value: 0; Manufacturer Name: Vishay; Manufacturer Part Number: CRCW08050000Z0EA; Part Number: CRCW08050000Z0EA
footprint RES_CRCW_0805_VIS
pins: 1, 2

## Crystal
designator X?  F0: 32MHz  (hidden comment: Crystal)
R: 500; Q: 50K; SimulationGenericComponent: True
simulation model CRYSTAL
pins: 1, 2

## CSD17381F4_0
designator Q?, comment CSD17381F4
Part Reference: Q1; Manufacturer Name: Texas Instruments; PCB Footprint: DFN100X60X35-3N; OriginalSymbolOrigin: (-30000,30000); Value: CSD17381F4; Manufacturer Part Number: CSD17381F4; Part Number: CSD17381F4
footprint DFN100X60X35-3N
pins: 1 D, 2 G, 3 S

## CSD17501Q5A
designator U?, comment CSD17501Q5A_DQJ_8
30-V, N channel NexFET power MOSFET, single SON 5 mm x 6 mm, 2.9 mOhm 8-VSONP -55 to 150; Manufacturer_Name: Texas Instruments; Part Reference: U7; PCB Footprint: DQJ8; Datasheet: https://www.ti.com/lit/gpn/csd17501q5a; Manufacturer_Part_Number: CSD17501Q5A; Copyright: Copyright (C) 2025 Ultra Librarian. All rights reserved.; Value: CSD17501Q5A_DQJ_8; Part Number: CSD17501Q5A; Manufacturer Part Number: CSD17501Q5A; Manufacturer Name: Texas Instruments
footprint DQJ8
pins: 1 S, 2 S_2, 3 S_3, 4 G, 5 D, 6 D_2, 7 D_3, 8 D_4

## DFE322512F-3R3MP2
designator L?, comment 3.3 uH
Manufacturer_Name: Murata; Manufacturer_Part_Number: DFE322512F-3R3M=P2; Part Reference: L1; Type: Fixed Inductors; PCB Footprint: IND_DFE322512F_MUR; Copyright: Copyright (C) 2025 Ultra Librarian. All rights reserved.; Value: 3.3 uH; Part Number: DFE322512F-3R3M=P2; Manufacturer Part Number: DFE322512F-3R3M=P2; Manufacturer Name: Murata
footprint IND_DFE322512F_MUR
pins: 1, 2

## DP350T05-7
designator U?
Part Reference: U6; Manufacturer Name: Diodes Inc.; OriginalSymbolOrigin: (-50000,20000); PCB Footprint: SOT95P240X110-3N; Value: DP350T05-7; Part Number: DP350T05-7; Manufacturer Part Number: DP350T05-7
footprint SOT95P240X110-3N
pins: 1 B, 2 E, 3 C

## ESDA25L
designator U?  (value not drawn)
- Clamp - Ipp Tvs Diode Surface Mount SOT-23-3; PCB Footprint: SOT-23-3L; MF: STMicroelectronics; OriginalSymbolOrigin: (-40000,30000); SnapEDA_Link: https://www.snapeda.com/parts/ESDA25L/STMicroelectronics/view-part/?ref=snap; Package: SOT-23-3 STMicroelectronics; MP: ESDA25L; Check_prices: https://www.snapeda.com/parts/ESDA25L/STMicroelectronics/view-part/?ref=eda; Value: ESDA25L
footprint SOT-23-3L
pins: 1 (io), 2 (io), 3 (io)

## INA818ID
designator U?
Low power (350-ÂµA), precision instrumentation amp with Â±60-V overvoltage protection (gain pins 1, 8) 8-SOIC -40 to 125; Manufacturer_Name: Texas Instruments; Copyright: Copyright (C) 2025 Ultra Librarian. All rights reserved.; Manufacturer_Part_Number: INA818ID; RefDes: RefDes; Type: Type
footprint SOIC-8_TEX
pins: 1 RG, 2 -IN (in), 3 +IN (in), 4 -VS, 5 REF (in), 6 OUT (out), 7 +VS, 8 RG

## Inductor
designator L?  value 10uH  (hidden comment: Inductor)
SimulationGenericComponent: True
simulation model L_Inductor_Default (INDUCTOR)
pins: 1, 2

## Inductor_1
designator L?, comment value 15nH  (hidden comment: Inductor)
SimulationGenericComponent: True
simulation model L_Inductor_Default (INDUCTOR)
pins: 1, 2

## Inductor_2
designator L?, comment value 3.9nH  (hidden comment: Inductor)
SimulationGenericComponent: True
simulation model L_Inductor_Default (INDUCTOR)
pins: 1, 2

## Inductor_3
designator L?, comment value 2.7nH  (hidden comment: Inductor)
SimulationGenericComponent: True
simulation model L_Inductor_Default (INDUCTOR)
pins: 1, 2

## IRLML6402TRPBF
designator Q?
P-Channel 20 V 3.7A (Ta) 1.3W (Ta) Surface Mount Micro3Ã¢â€žÂ¢ /SOT-23; MF: Infineon; SnapEDA_Link: https://www.snapeda.com/parts/IRLML6402TRPBF/Infineon/view-part/?ref=snap; Package: SOT-23-3 ON Semiconductor; Value: *; MP: IRLML6402TRPBF; Check_prices: https://www.snapeda.com/parts/IRLML6402TRPBF/Infineon/view-part/?ref=eda
footprint SOT95P237X112-3N
pins: 1 G, 2 S, 3 D

## LED
designator LED?  (value not drawn)
Red 619nm LED Indication - Discrete 1.9V Radial; Part Reference: LED1; PCB Footprint: LED3MM; MF: Vishay; MP: TLLR4400; OriginalSymbolOrigin: (-20000,0); SnapEDA_Link: https://www.snapeda.com/parts/TLLR4400/Vishay+Semiconductor+Opto+Division/view-part/?ref=snap; Package: None; Check_prices: https://www.snapeda.com/parts/TLLR4400/Vishay+Semiconductor+Opto+Division/view-part/?ref=eda; Value: LED; Part Number: TLLR4400; Manufacturer Part Number: TLLR4400; Manufacturer Name: Vishay
footprint LED3MM
pins: A, K C

## MBRS540T3G
designator CR?, comment DIODE
Manufacturer_Name: onsemi; Manufacturer_Part_Number: MBRS540T3G; Part Reference: CR3; PCB Footprint: DIODE_SMC_7P15X6P25_ONS; Copyright: Copyright (C) 2025 Ultra Librarian. All rights reserved.; Value: DIODE; Part Number: MBRS540T3G; Manufacturer Part Number: MBRS540T3G; Manufacturer Name: onsemi
footprint DIODE_SMC_7P15X6P25_ONS
pins: 1, 2

## mcp1804t-a002iot
designator U?
Manufacturer_Name: Microchip; Manufacturer_Part_Number: MCP1804T-A002I/OT; Part Reference: U11; PCB Footprint: SOT-23-5_MC_MCH; Copyright: Copyright (C) 2025 Ultra Librarian. All rights reserved.; Value: mcp1804t-a002iot; Part Number: mcp1804t-a002i/ot; Manufacturer Part Number: mcp1804t-a002i/ot; Manufacturer Name: Microchip
footprint SOT-23-5_MC_MCH
pins: 1 VIN (in), 2 GND (power), 3 NC, 4 SHDN* (in), 5 VOUT (out)

## MCP3562RT-EST
designator U?, comment MCP3562RT-E/ST
Description; Manufacturer_Name: Microchip; Copyright: Copyright (C) 2025 Ultra Librarian. All rights reserved.; Manufacturer_Part_Number: MCP3562RT-E/ST; RefDes: RefDes; Type: Type
footprint TSSOP20_ST_MCH
pins: 1 AVDD (power), 2 AGND (power), 3 REFIN- (in), 4 REFIN+/OUT (io), 5 CH0, 6 CH1, 7 CH2, 8 CH3, 9 NC, 10 NC, 11 NC, 12 NC, 13 *CS (in), 14 SCK (in), 15 SDI (in), 16 SDO (out), 17 *IRQ/MDAT (out), 18 MCLK (io), 19 DGND (power), 20 DVDD (power)

## MMSZ5232BS-7-F
designator CR?, comment DIODE_ZENER
Manufacturer_Part_Number: MMSZ5232BS-7-F; Manufacturer_Name: Diodes Inc; Part Reference: CR1; Type: Diodes - Zener Single; PCB Footprint: ZDO_SOD323_DIO; Copyright: Copyright (C) 2025 Ultra Librarian. All rights reserved.; Value: DIODE_ZENER; Manufacturer Name: Diodes Inc; Manufacturer Part Number: MMSZ5232BS-7-F; Part Number: MMSZ5232BS-7-F
footprint ZDO_SOD323_DIO
pins: 1 CATHODE, 2 ANODE

## MMSZ5246B-7-F
designator CR?, comment DIODE  (value not drawn)
Manufacturer_Name: Diodes Inc; Manufacturer_Part_Number: MMSZ5246B-7-F; Part Reference: CR7; PCB Footprint: SOD123_DIO; Copyright: Copyright (C) 2025 Ultra Librarian. All rights reserved.; Value: DIODE; Part Number: MMSZ5246B-7-F; Manufacturer Part Number: MMSZ5246B-7-F; Manufacturer Name: Diodes Inc
footprint SOD123_DIO
pins: 1, 2

## MURS360T3G
designator D?
Part Reference: D3; Manufacturer Name: ON Semiconductor; PCB Footprint: DIOM7959X261N; OriginalSymbolOrigin: (-10000,10000); Value: MURS360T3G; Part Number: MURS360T3G; Manufacturer Part Number: MURS360T3G
footprint DIOM7959X261N
pins: A, C K

## NCU15XH103F6SRC
designator RT?, comment 10 k
Part Reference: RT1; Part Number: NCU15XH103F6SRC; Manufacturer Name: Murata Electronics; PCB Footprint: THRMC1005X55N; OriginalSymbolOrigin: (-20000,10000); Value: 10 k; Manufacturer Part Number: NCU15XH103F6SRC
footprint THRMC1005X55N
pins: 1, 2

## NRF52832-QFAA-R7
designator U?
Description; Manufacturer_Name: Nordic Semiconductor; Copyright: Copyright (C) 2025 Ultra Librarian. All rights reserved.; Manufacturer_Part_Number: NRF52832-QFAA-R7; RefDes: RefDes; Type: Type
footprint QFN48_6X6_QF_NOR
pins: 1 DEC1 (power), 2 P0.00/XL1 (io), 3 P0.01/XL2 (io), 4 P0.02/AIN0 (io), 5 P0.03/AIN1 (io), 6 P0.04/AIN2 (io), 7 P0.05/AIN3 (io), 8 P0.06 (io), 9 P0.07 (io), 10 P0.08 (io), 11 NFC1/P0.09 (io), 12 NFC2/P0.10 (io), 13 VDD (power), 14 P0.11 (io), 15 P0.12 (io), 16 P0.13 (io), 17 P0.14/TRACEDATA[3] (io), 18 P0.15/TRACEDATA[2] (io), 19 P0.16/TRACEDATA[1] (io), 20 P0.17 (io), 21 P0.18/TRACEDATA[0]/SWO (io), 22 P0.19 (io), 23 P0.20/TRACECLK (io), 24 P0.21/NRESET (io), 25 SWDCLK (in), 26 SWDIO (io), 27 P0.22 (io), 28 P0.23 (io), 29 P0.24 (io), 30 ANT, 31 VSS (power), 32 DEC2 (power), 33 DEC3 (power), 34 XC1 (in), 35 XC2 (in), 36 VDD (power), 37 P0.25 (io), 38 P0.26 (io), 39 P0.27 (io), 40 P0.28/AIN4 (io), 41 P0.29/AIN5 (io), 42 P0.30/AIN6 (io), 43 P0.31/AIN7 (io), 44 NC, 45 VSS (power), 46 DEC4 (power), 47 DCC (power), 48 VDD (power), 49 VSS (power)

## RC1206FR-0713K7L
designator R?, comment 13.7 k
13.7 kOhms Â±1% 0.25W, 1/4W Chip Resistor 1206 (3216 Metric) Moisture Resistant Thick Film; MF: Yageo; MP: RC1206FR-0713K7L; SnapEDA_Link: https://www.snapeda.com/parts/RC1206FR-0713K7L/Yageo/view-part/?ref=snap; Package: 3116 Yageo; Value: *; Check_prices: https://www.snapeda.com/parts/RC1206FR-0713K7L/Yageo/view-part/?ref=eda
footprint RESC3116X65N
pins: 1, 2

## RC1210JR-07100RL
designator R?, comment 100
100 Ohms Â±5% 0.5W, 1/2W Chip Resistor 1210 (3225 Metric) Moisture Resistant Thick Film; MF: Yageo; MP: RC1210JR-07100RL; SnapEDA_Link: https://www.snapeda.com/parts/RC1210JR-07100RL/Yageo/view-part/?ref=snap; Package: 3126 Yageo; Value: *; Check_prices: https://www.snapeda.com/parts/RC1210JR-07100RL/Yageo/view-part/?ref=eda; Supplier 1: Avnet; Supplier Part Number 1: RC1210JR-07100RL
footprint RESC3126X65N
pins: 1, 2

## RC2010FK-071KL
designator R?, comment 1 k
Part Reference: R40; Manufacturer Name: Yageo; Manufacturer Part Number: RC2010FK-071KL; OriginalSymbolOrigin: (-20000,10000); PCB Footprint: RESC5025X65N; Value: 1 k; Part Number: RC2010FK-071KL
footprint RESC5025X65N
pins: 1, 2

## RC2010FK-07100KL
designator R?, comment 100 k
Part Reference: R1; Manufacturer Name: Yageo; Manufacturer Part Number: RC2010FK-07100KL; OriginalSymbolOrigin: (-20000,10000); PCB Footprint: RESC5025X65N; Value: 100 k; Part Number: RC2010FK-07100KL
footprint RESC5025X65N
pins: 1, 2

## RC2010FK-07499KL
designator R?, comment 499 k
Part Reference: R35; Manufacturer Name: Yageo; Manufacturer Part Number: RC2010FK-07499KL; OriginalSymbolOrigin: (-20000,10000); PCB Footprint: RESC5025X65N; Value: 499 k; Part Number: RC2010FK-07499KL
footprint RESC5025X65N
pins: 1, 2

## RC2010FK-07560KL
designator R?, comment 560 k
Part Reference: R23; Manufacturer Name: Yageo; Manufacturer Part Number: RC2010FK-07560KL; OriginalSymbolOrigin: (-20000,10000); PCB Footprint: RESC5025X65N; Value: 560 k; Part Number: RC2010FK-07560KL
footprint RESC5025X65N
pins: 1, 2

## RC2010JK-079K1L
designator R?, comment 9.1 k
Part Reference: R16; Part Number: RC2010JK-079K1L; Manufacturer Name: Yageo; PCB Footprint: RESC5025X65N; OriginalSymbolOrigin: (-20000,10000); Value: 9.1 k; Manufacturer Part Number: RC2010JK-079K1L
footprint RESC5025X65N
pins: 1, 2

## RC2010JK-0710KL
designator R?, comment 10 k
MP: RC2010JK-0710KL; Package: None; Price: None; Value: *; Availability: Unavailable; Supplier 1: Avnet; Supplier Part Number 1: 49AK3933
footprint RESC5025X65N
footprint RESC5025X65N
pins: 1, 2

## Resistor
designator R?  value 50 Trace  (hidden comment: Resistor)
TC1: 0; SimulationGenericComponent: True; TC2: 0
simulation model R_Resistor_Default (Model Description)
pins: 1, 2

## Resistor_1
designator R?, comment value 0  (hidden comment: Resistor)
SimulationGenericComponent: True; TC1: 0; TC2: 0
simulation model R_Resistor_Default (Model Description)
pins: 1, 2

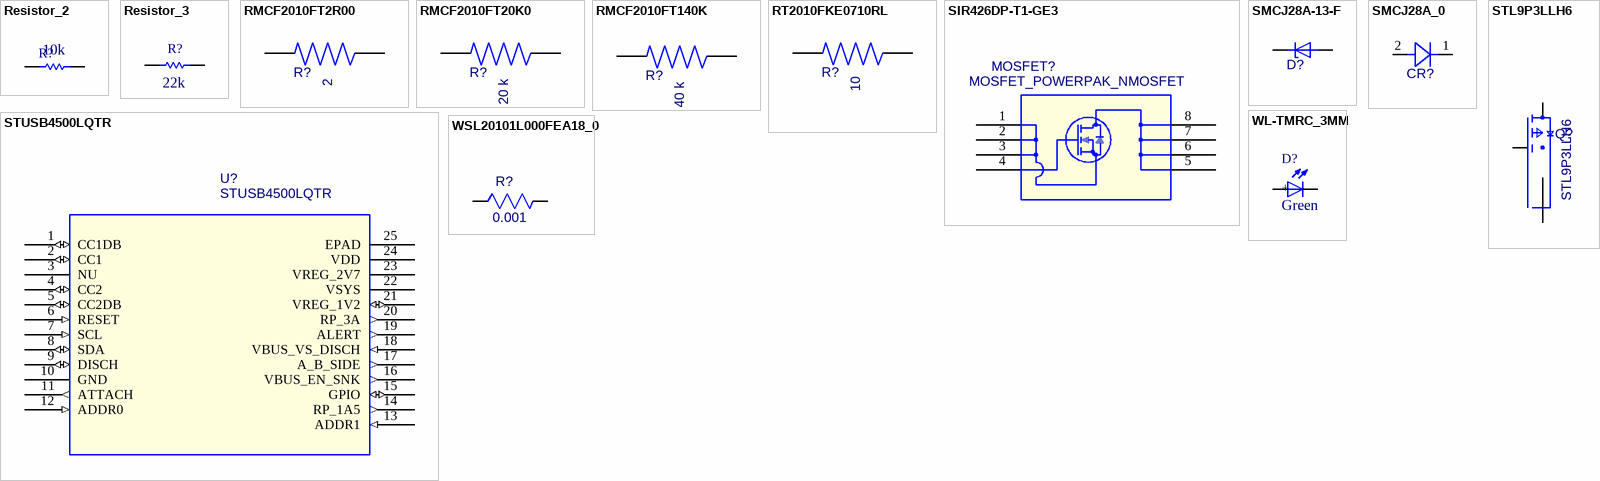
[diagram p2: symbols Resistor_2 to WSL20101L000FEA18_0]

## Resistor_2
designator R?, comment value 10k  (hidden comment: Resistor)
TC1: 0; SimulationGenericComponent: True; TC2: 0
simulation model R_Resistor_Default (Model Description)
pins: 1, 2

## Resistor_3
designator R?, comment value 22k  (hidden comment: Resistor)
TC1: 0; SimulationGenericComponent: True; TC2: 0
simulation model R_Resistor_Default (Model Description)
pins: 1, 2

## RMCF2010FT2R00
designator R?, comment 2
Part Reference: R14; Manufacturer Name: Stackpole Electronics Inc; Manufacturer Part Number: RMCF2010FT2R00; PCB Footprint: RESC5025X70N; OriginalSymbolOrigin: (-20000,10000); Value: 2; Part Number: RMCF2010FT2R00
footprint RESC5025X70N
pins: 1, 2

## RMCF2010FT20K0
designator R?, comment 20 k
Part Reference: R53; Manufacturer Name: Stackpole Electronics Inc; Manufacturer Part Number: RMCF2010FT20K0; OriginalSymbolOrigin: (-20000,10000); PCB Footprint: RESC5025X70N; Value: 20 k; Part Number: RMCF2010FT20K0
footprint RESC5025X70N
pins: 1, 2

## RMCF2010FT140K
designator R?, comment 140 k
Part Reference: R20; Manufacturer Name: Stackpole Electronics Inc; Manufacturer Part Number: RMCF2010FT140K; OriginalSymbolOrigin: (-20000,10000); PCB Footprint: RESC5025X70N; Value: 140 k; Part Number: RMCF2010FT140K
footprint RESC5025X70N
pins: 1, 2

## RT2010FKE0710RL
designator R?, comment 10
Part Reference: R15; Manufacturer Name: Yageo; Manufacturer Part Number: RT2010FKE0710RL; PCB Footprint: RESC5025X65N; OriginalSymbolOrigin: (-20000,10000); Value: 10; Part Number: RT2010FKE0710RL
footprint RESC5025X65N
pins: 1, 2

## SIR426DP-T1-GE3
designator MOSFET?, comment MOSFET_POWERPAK_NMOSFET
N-CHANNEL 40-V (D-S) MOSFET; Manufacturer_Name: Vishay; Manufacturer_Part_Number: SIR426DP-T1-GE3; Part Reference: MOSFET2; PCB Footprint: POWERPAK_SO-8_SINGLE; Copyright: Copyright (C) 2025 Ultra Librarian. All rights reserved.; Datasheet: https://www.vishay.com/doc?65162; Value: MOSFET_POWERPAK_NMOSFET; Manufacturer Name: Vishay; Manufacturer Part Number: SIR426DP-T1-GE3; Part Number: SIR426DP-T1-GE3
footprint POWERPAK_SO-8_SINGLE
pins: 1, 2, 3, 4, 5, 6, 7, 8

## SMCJ28A-13-F
designator D?
Part Reference: D2; Manufacturer Name: Diodes Inc.; PCB Footprint: DIOM7959X250N; OriginalSymbolOrigin: (-10000,10000); Value: SMCJ28A-13-F; Part Number: SMCJ28A-13-F; Manufacturer Part Number: SMCJ28A-13-F; Supplier 1: Avnet; Supplier Part Number 1: SMCJ28A-13-F
footprint DIOM7959X250N
footprint DIOM7959X250N
pins: A, C

## SMCJ28A_0
designator CR?, comment DIODE  (value not drawn)
Manufacturer_Name: Bourns Electronics; Manufacturer_Part_Number: SMCJ28A; Part Reference: CR6; PCB Footprint: DIODE_DO-214AC; Copyright: Copyright (C) 2025 Ultra Librarian. All rights reserved.; Value: DIODE; Manufacturer Name: Bourns Electronics; Manufacturer Part Number: SMCJ28A; Part Number: SMCJ28A
footprint DIODE_DO-214AC
pins: 1, 2

## STL9P3LLH6
designator Q?
P-Channel 30 V 9A (Tc) 3W (Ta) Surface Mount PowerFlat (3.3x3.3); Part Reference: Q3; OriginalSymbolOrigin: (0,10000); MF: STMicroelectronics; PCB Footprint: TRANS_STL9P3LLH6; Check_prices: https://www.snapeda.com/parts/STL9P3LLH6/STMicroelectronics/view-part/?ref=eda; MP: STL9P3LLH6; Package: None; SnapEDA_Link: https://www.snapeda.com/parts/STL9P3LLH6/STMicroelectronics/view-part/?ref=snap; Value: STL9P3LLH6; Part Number: STL9P3LLH6; Manufacturer Part Number: STL9P3LLH6; Manufacturer Name: STMicroelectronics
footprint TRANS_STL9P3LLH6
pins: 1 S, 2 S_1, 3 S_2, 4 G, 5 D, 5_1 D_1, 5_2 D_2

## STUSB4500LQTR
designator U?
Standalone USB Type-C port controller for power sinking devices; Manufacturer_Name: STMicroelectronics; Part Reference: U9; PCB Footprint: QFN24_STUSB4500_STM; Datasheet: https://www.st.com/resource/en/datasheet/stusb4500l.pdf; Manufacturer_Part_Number: STUSB4500LQTR; Copyright: Copyright (C) 2025 Ultra Librarian. All rights reserved.; Value: STUSB4500LQTR; Part Number: STUSB4500LQTR; Manufacturer Part Number: STUSB4500LQTR; Manufacturer Name: STMicroelectronics
footprint QFN24_STUSB4500_STM
pins: 1 CC1DB (io), 2 CC1 (io), 3 NU (power), 4 CC2 (io), 5 CC2DB (io), 6 RESET (in), 7 SCL (in), 8 SDA (io), 9 DISCH (io), 10 GND (power), 11 ATTACH (out), 12 ADDR0 (in), 13 ADDR1 (in), 14 RP_1A5 (out), 15 GPIO (io), 16 VBUS_EN_SNK (out), 17 A_B_SIDE (out), 18 VBUS_VS_DISCH (in), 19 ALERT (out), 20 RP_3A (out), 21 VREG_1V2 (io), 22 VSYS (power), 23 VREG_2V7 (power), 24 VDD (power), 25 EPAD (power)

## WL-TMRC_3MM
designator D?, comment Green
MF: {'manufacturer': u'W\xfcrth Elektronik'}; MP: 151031VS06000; Package: None; Price: None; Value: *; Availability: Unavailable
footprint WL-TMRC_3MM
pins: 1 POS, 2 NEG
text: +

## WSL20101L000FEA18_0
designator R?, comment 0.001
WSL-2010-18 .001 1p EA e3; Manufacturer_Name: Vishay; Manufacturer_Part_Number: WSL20101L000FEA18; Part Reference: R18; PCB Footprint: RC2010N_VIS; Copyright: Copyright (C) 2025 Ultra Librarian. All rights reserved.; Datasheet: https://www.vishay.com/doc?31057; Value: 0.001; Part Number: WSL20101L000FEA18; Manufacturer Part Number: WSL20101L000FEA18; Manufacturer Name: Vishay
footprint RC2010N_VIS
pins: 1, 2